# Altium footprint library 我的器件.PCBLIB: 450 footprints (part 13 of 29)
Each footprint in its own frame and in the unit in brackets; x right, y up, seen from the top. Pads: shape width x height; smd on the part's side, far side on the other; paste and mask are expansions set on the pad; w line width, h text height; cw(c..) or ccw(c..) is an arc to the next point about the centre after c.
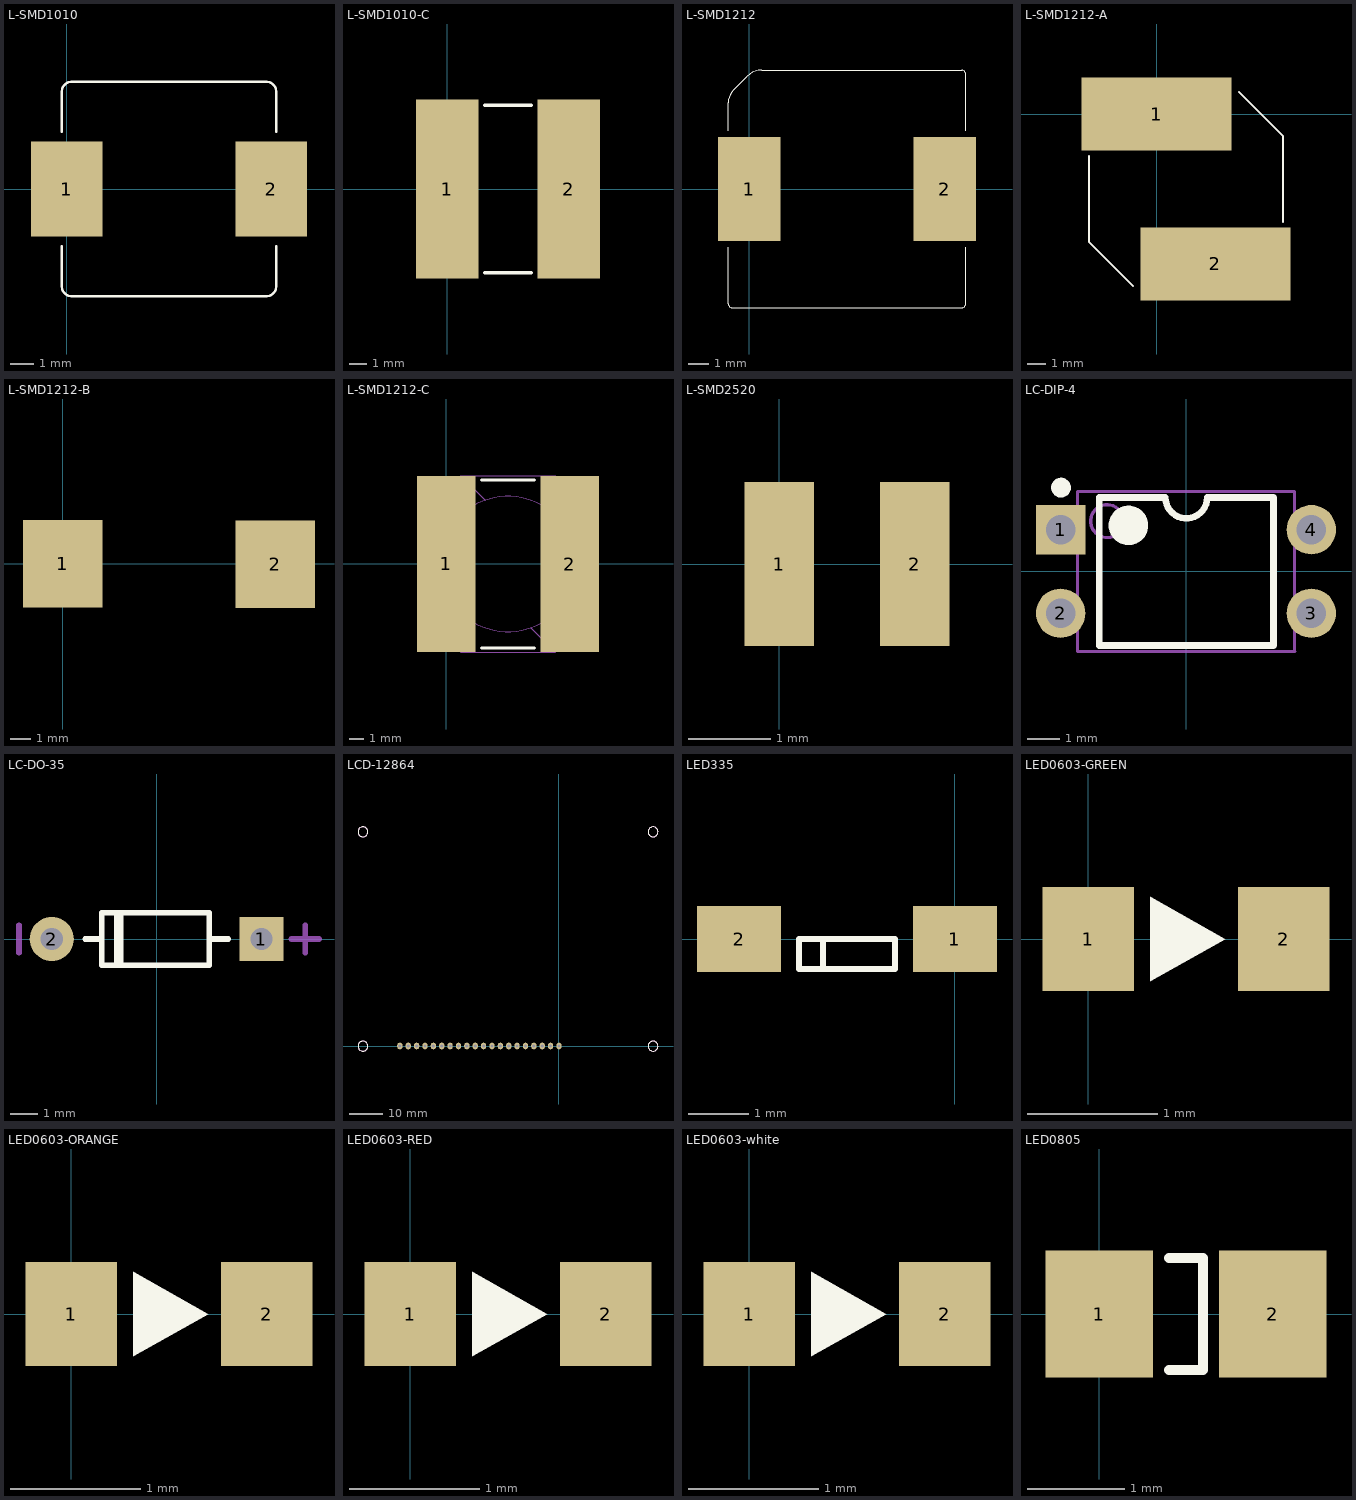
[diagram p12: the footprints below, top view; thin cyan lines are the x and y axes]

## L-SMD1010 [mm]
pads (2):
  rect 3x4 smd: 1(0,0) 2(8.6,0)
Top Overlay:
  lines w0.1: -0.2,-2.4 -0.2,-4.1 ccw(c0.2,-4.1) 0.2,-4.5 8.4,-4.5 ccw(c8.4,-4.1) 8.8,-4.1 8.8,-2.4 ; -0.2,2.4 -0.2,4.1 cw(c0.2,4.1) 0.2,4.5 8.4,4.5 cw(c8.4,4.1) 8.8,4.1 8.8,2.4
3D body: height 3, standoff 0, extent 9.35,-1.7 9.7,1.7
3D body: height 3, standoff 0, extent -1.1,-1.7 -0.75,1.7
3D body: height 4, standoff 0.1, extent -0.75,-5.05 9.35,5.05

## L-SMD1010-C [mm]
pads (2):
  rect 3.5x10 smd: 1(0,0) 2(6.8,0)
Top Overlay:
  lines w0.2: 2.1,-4.7 4.7,-4.7 ; 2.1,4.7 4.7,4.7
3D body: height 6.7, standoff 0.1, extent -0.625,-4.025 4.55,1.15
3D body: height 6.7, standoff 0.1, extent 2.25,-1.15 7.425,4.025
3D body: height 6.8, standoff 0.1, extent -1.6,-5 5.7,2.3
3D body: height 5, standoff 0.1, extent -1.6,1.15 2.25,5
3D body: height 5.2, standoff 4, extent -1.2,1.95 1.45,4.6
3D body: height 5.2, standoff 0.1, extent -1.2,2.75 0.65,4.6
3D body: height 5.2, standoff 0.1, extent 6.15,-4.6 8,-2.75
3D body: height 5.2, standoff 4, extent 5.35,-4.6 8,-1.95
3D body: height 5, standoff 0.1, extent 4.55,-5 8.4,-1.15
3D body: height 6.8, standoff 0.1, extent 1.1,-2.3 8.4,5
3D body: height 6.8, standoff 0, extent -0.396,-3.799 7.2,3.799

## L-SMD1212 [mm] "SMD  Inductance,Body 12mmX12mm"
height 10
pads (2):
  rect 3x5 smd: 1(0,0) 2(9.4,0)
Top Overlay:
  lines w0.05: -1,-2.8 -1,-5.5 ccw(c-0.8,-5.5) -0.8,-5.7 10.2,-5.7 ccw(c10.2,-5.5) 10.4,-5.5 10.4,-2.8 ; -1,2.8 -1,4.15 cw(c-0.155,4.15) -0.753,4.747 -0.083,5.417 cw(c0.6,4.734) 0.6,5.7 10.2,5.7 cw(c10.2,5.5) 10.4,5.5 10.4,2.8
3D body: height 1, standoff -0.01, extent -1.398,-6.098 10.798,6.098
3D body: height 7.5, standoff 0, extent -1.393,-6.098 10.8,6.099
3D body: height 7.51, standoff 0, extent -0.558,-5.289 10,5.29
3D body: height 7.52, standoff 0, extent 0.136,-4.591 9.3,4.591
3D body: height 1.2, standoff 0, extent -1.45,-1.75 0.05,1.75
3D body: height 1.2, standoff 0, extent 9.35,-1.75 10.85,1.75

## L-SMD1212-A [mm]
pads (2):
  rect 8.2x4 smd: 1(0,0) 2(3.2,-8.2)
Top Overlay:
  lines w0.1: -3.7,-2.3 -3.7,-7 -1.3,-9.4 ; 4.5,1.2 6.9,-1.2 6.9,-5.9
3D body: height 5.2, standoff 0.1, extent 4.8,-10.175 7.675,-7.3
3D body: height 7.7, standoff 0.1, extent -3.175,-8.875 3.275,-2.425
3D body: height 7.7, standoff 0.1, extent -0.075,-5.775 6.375,0.675
3D body: height 5, standoff 0.1, extent -4.4,-2.425 -0.075,1.9
3D body: height 5.2, standoff 5, extent -4.475,-2.175 -0.325,1.975
3D body: height 5.2, standoff 0.1, extent -4.475,-0.9 -1.6,1.975
3D body: height 5, standoff 0.1, extent 3.275,-10.1 7.6,-5.775
3D body: height 5.2, standoff 5, extent 3.525,-10.175 7.675,-6.025
3D body: height 7.8, standoff 0, extent -2.999,-8.695 6.199,0.5
3D body: height 7.7, standoff 0.1, extent -4.4,-10.1 4.8,-0.9
3D body: height 7.7, standoff 0.1, extent -1.6,-7.3 7.6,1.9

## L-SMD1212-B [mm]
pads (2):
  rect 3.8x4.2 smd: 1(0,0) 2(10.2,0)
3D body: height 2.4, standoff 0, extent 11.5,-2.1 11.9,2.1
3D body: height 0.3, standoff 0, extent 8.4,-2.1 11.9,2.1
3D body: height 0.3, standoff 0, extent -1.7,-2.1 1.8,2.1
3D body: height 2.4, standoff 0, extent -1.7,-2.1 -1.3,2.1
3D body: height 6, standoff 0.1, extent -1.3,-6.4 11.5,6.4

## L-SMD1212-C [mm]
pads (2):
  rect 4x12 smd: 1(0,0) 2(8.4,0)
Top Overlay:
  lines w0.2: 2.4,-5.7 6,-5.7 ; 2.4,5.7 6,5.7
Mechanical 1:
  circle w0.05: c4.2,0 r4.6
  lines w0.05: -0.15,1.55 -1.8,3.2 ; -0.125,1.525 -1.8,3.2 ; 5.75,-4.35 7.4,-6 ; 8.55,-1.55 10.2,-3.2 ; -1.8,3.2 1,6 ; -1.8,3.2 1,6 ; -1.8,3.2 -1.8,-3.2 1,-6 7.4,-6 ; 1,6 2.65,4.35 1,6 ; 1,6 7.4,6 10.2,3.2 10.2,-3.2 ; 7.4,-6 10.2,-3.2
3D body: height 7.7, standoff 0.1, extent -0.575,-4.775 5.875,1.675
3D body: height 7.7, standoff 0.1, extent 2.525,-1.675 8.975,4.775
3D body: height 5, standoff 0.1, extent -1.8,1.675 2.525,6
3D body: height 5.2, standoff 5, extent -1.875,1.925 2.275,6.075
3D body: height 5.2, standoff 0.1, extent -1.875,3.2 1,6.075
3D body: height 5, standoff 0.1, extent 5.875,-6 10.2,-1.675
3D body: height 5.2, standoff 5, extent 6.125,-6.075 10.275,-1.925
3D body: height 5.2, standoff 0.1, extent 7.4,-6.075 10.275,-3.2
3D body: height 7.8, standoff 0, extent -0.399,-4.595 8.799,4.6
3D body: height 7.7, standoff 0.1, extent -1.8,-6 7.4,3.2
3D body: height 7.7, standoff 0.1, extent 1,-3.2 10.2,6

## L-SMD2520 [mm]
height 1.2
pads (2):
  rect 0.85x2 smd: 1(0,0) 2(1.65,0)
3D body: height 0.9, standoff 0.4, extent -0.2,-0.875 1.875,0.875
3D body: height 1.2, standoff 0.9, extent -0.475,-1.1 2.125,1.1
3D body: height 0.4, standoff 0, extent -0.475,-1.1 2.125,1.1

## LC-DIP-4 [mm]
pads (4):
  rect 1.5x1.5 hole 0.9: 1(-3.81,1.27)
  round 1.5 hole 0.9: 2(-3.81,-1.27) 3(3.81,-1.27) 4(3.81,1.27)
Top Overlay:
  circle w0.3: c-3.8,2.55 r0.15
  circle w0.6: c-1.75,1.4 r0.3
  lines w0.2: -2.64,-2.25 2.66,-2.25 2.66,2.25 0.645,2.25 cw(c0.01,2.25) -0.625,2.25 -2.64,2.25 -2.64,-2.25
Mechanical 13:
  circle w0.1: c-2.4,1.53 r0.5
  lines w0.1: -3.3,-2.43 -3.3,2.43 3.3,2.43 3.3,-2.43 ; -3.29,-2.43 3.31,-2.43

## LC-DO-35 [mm]
pads (2):
  rect 1.6x1.6 hole 0.8: 1(3.81,0)
  round 1.6 hole 0.8: 2(-3.81,0)
Top Overlay:
  lines w0.2: -2.6,0 -2.001,0 ; -1.448,-0.95 -1.448,0.95 ; -1.3,-0.95 -1.3,0.95 ; 1.899,-0.95 -2.001,-0.95 -2.001,0.95 1.899,0.95 ; 1.911,-0.95 1.911,0.95 ; 1.911,0 2.6,0
Mechanical 15:
  lines w0.203: -5,-0.5 -5,0.5 ; 4.9,0 5.9,0 ; 5.4,-0.5 5.4,0.5
3D body "DO-35.STEP": height 1.92, standoff -1.9, extent -4.098,-0.888 4.072,0.914

## LCD-12864 [mm]
pads (20):
  oval 1.6x2 hole 1: 1(0,0) 2(-2.54,0) 3(-5.08,0) 4(-7.62,0) 5(-10.16,0) 6(-12.7,0) 7(-15.24,0) 8(-17.78,0) 9(-20.32,0) 10(-22.86,0) 11(-25.4,0) 12(-27.94,0) 13(-30.48,0) 14(-33.02,0) 15(-35.56,0) 16(-38.1,0) 17(-40.64,0) 18(-43.18,0) 19(-45.72,0) 20(-48.26,0)
Top Overlay:
  circle w0.2: c-59.46,-0.04 r1.5
  circle w0.2: c28.54,-0.04 r1.5
  circle w0.2: c28.54,64.96 r1.5
  circle w0.2: c-59.46,64.96 r1.5
Keep-Out Layer:
  circle w0.2: c-59.46,-0.04 r1.5
  circle w0.2: c28.54,-0.04 r1.5
  circle w0.2: c28.54,64.96 r1.5
  circle w0.2: c-59.46,64.96 r1.5
3D body: height 15.2, standoff 6.6, extent -54.465,32.71 24.05,58.47
3D body: height 15.2, standoff 6.6, extent -54.47,6.95 24.045,32.71
3D body: height 14.7, standoff 6.6, extent -51.71,13.21 21.29,52.21
3D body: height 6.6, standoff 5, extent -61.96,-2.54 31.04,67.46
3D body: height 6.7, standoff 4.9, extent -0.9,-1.1 0.9,1.1
3D body: height 7.7, standoff -2, extent -0.4,-0.4 0.4,0.4
3D body: height 7.7, standoff -2, extent -2.94,-0.4 -2.14,0.4
3D body: height 6.7, standoff 4.9, extent -3.44,-1.1 -1.64,1.1
3D body: height 7.7, standoff -2, extent -5.48,-0.4 -4.68,0.4
3D body: height 6.7, standoff 4.9, extent -5.98,-1.1 -4.18,1.1
3D body: height 7.7, standoff -2, extent -8.02,-0.4 -7.22,0.4
3D body: height 6.7, standoff 4.9, extent -8.52,-1.1 -6.72,1.1
3D body: height 7.7, standoff -2, extent -10.56,-0.4 -9.76,0.4
3D body: height 6.7, standoff 4.9, extent -11.06,-1.1 -9.26,1.1
3D body: height 7.7, standoff -2, extent -13.1,-0.4 -12.3,0.4
3D body: height 6.7, standoff 4.9, extent -13.6,-1.1 -11.8,1.1
3D body: height 7.7, standoff -2, extent -15.64,-0.4 -14.84,0.4
3D body: height 6.7, standoff 4.9, extent -16.14,-1.1 -14.34,1.1
3D body: height 7.7, standoff -2, extent -18.18,-0.4 -17.38,0.4
3D body: height 6.7, standoff 4.9, extent -18.68,-1.1 -16.88,1.1
3D body: height 7.7, standoff -2, extent -20.72,-0.4 -19.92,0.4
3D body: height 6.7, standoff 4.9, extent -21.22,-1.1 -19.42,1.1
3D body: height 7.7, standoff -2, extent -23.26,-0.4 -22.46,0.4
3D body: height 6.7, standoff 4.9, extent -23.76,-1.1 -21.96,1.1
3D body: height 7.7, standoff -2, extent -25.8,-0.4 -25,0.4
3D body: height 6.7, standoff 4.9, extent -26.3,-1.1 -24.5,1.1
3D body: height 7.7, standoff -2, extent -28.34,-0.4 -27.54,0.4
3D body: height 6.7, standoff 4.9, extent -28.84,-1.1 -27.04,1.1
3D body: height 7.7, standoff -2, extent -30.88,-0.4 -30.08,0.4
3D body: height 6.7, standoff 4.9, extent -31.38,-1.1 -29.58,1.1
3D body: height 7.7, standoff -2, extent -33.42,-0.4 -32.62,0.4
3D body: height 6.7, standoff 4.9, extent -33.92,-1.1 -32.12,1.1
3D body: height 7.7, standoff -2, extent -35.96,-0.4 -35.16,0.4
3D body: height 6.7, standoff 4.9, extent -36.46,-1.1 -34.66,1.1
3D body: height 7.7, standoff -2, extent -38.5,-0.4 -37.7,0.4
3D body: height 6.7, standoff 4.9, extent -39,-1.1 -37.2,1.1
3D body: height 7.7, standoff -2, extent -41.04,-0.4 -40.24,0.4
3D body: height 6.7, standoff 4.9, extent -41.54,-1.1 -39.74,1.1
3D body: height 7.7, standoff -2, extent -43.58,-0.4 -42.78,0.4
3D body: height 6.7, standoff 4.9, extent -44.08,-1.1 -42.28,1.1
3D body: height 7.7, standoff -2, extent -46.12,-0.4 -45.32,0.4
3D body: height 6.7, standoff 4.9, extent -46.62,-1.1 -44.82,1.1
3D body: height 7.7, standoff -2, extent -48.66,-0.4 -47.86,0.4
3D body: height 6.7, standoff 4.9, extent -49.16,-1.1 -47.36,1.1
3D body: height 9.6, standoff 6.6, extent 24.04,10.46 31.04,54.46

## LED335 [mm]
pads (2):
  rect 1.4x1.1 smd: 1(0,0) 2(-3.6,0)
Top Overlay:
  lines w0.1: -2.2,-0.5 -2.2,0 ; -2.6,-0.5 -2.6,0 -1,0 -1,-0.5 -2.6,-0.5
3D body: height 0.6, standoff 0.2, extent -2,-0.5 -1.6,-0.2
3D body: height 0.6, standoff 0.1, extent -3.8,-0.4 -3.2,-0.2
3D body: height 0.6, standoff 0.1, extent -0.4,-0.4 0.2,-0.2
3D body: height 0.7, standoff 0.1, extent -2.8,-1 -0.8,-0.2
3D body: height 0.8, standoff 0, extent -3.2,-1 -0.4,0.4
3D body: height 0.8, standoff 0.7, extent -3.2,-1 -0.4,0.4
3D body: height 0.2, standoff 0, extent -3.8,-0.4 -3.2,0.4
3D body: height 0.2, standoff 0, extent -0.4,-0.4 0.2,0.4
3D body: height 0.1, standoff 0, extent -3.2,-1 -0.4,0.4

## LED0603-GREEN [mm]
pads (2):
  rect 0.7x0.8 smd: 1(0,0) 2(1.5,0)
Top Overlay:
  region: 0.475,0.325 0.475,-0.325 1.05,0
3D body: height 0.38, standoff 0.32, extent 0.7,-0.042 0.962,0.307
3D body: height 0.35, standoff 0.2, extent 0.895,0.245 0.955,0.305
3D body: height 0.35, standoff 0.3, extent 0.72,-0.03 0.78,0.03
3D body: height 0.3, standoff 0.2, extent 0.65,-0.1 0.85,0.1
3D body: height 0.21, standoff 0.2, extent 0.525,-0.375 1.55,0.375
3D body: height 0.21, standoff 0.2, extent -0.05,-0.375 0.95,0.377
3D body: height 0.2, standoff 0, extent 0.75,-0.4 1.55,0.4
3D body: height 0.65, standoff 0.21, extent 0.225,-0.4 1.225,0.4
3D body: height 0.2, standoff 0, extent -0.05,-0.4 0.75,0.4

## LED0603-ORANGE [mm]
pads (2):
  rect 0.7x0.8 smd: 1(0,0) 2(1.5,0)
Top Overlay:
  region: 0.475,0.325 0.475,-0.325 1.05,0
3D body: height 0.38, standoff 0.32, extent 0.7,-0.042 0.962,0.307
3D body: height 0.35, standoff 0.2, extent 0.895,0.245 0.955,0.305
3D body: height 0.35, standoff 0.3, extent 0.72,-0.03 0.78,0.03
3D body: height 0.3, standoff 0.2, extent 0.65,-0.1 0.85,0.1
3D body: height 0.21, standoff 0.2, extent 0.525,-0.375 1.55,0.375
3D body: height 0.21, standoff 0.2, extent -0.05,-0.375 0.95,0.377
3D body: height 0.2, standoff 0, extent 0.75,-0.4 1.55,0.4
3D body: height 0.65, standoff 0.21, extent 0.225,-0.4 1.225,0.4
3D body: height 0.2, standoff 0, extent -0.05,-0.4 0.75,0.4

## LED0603-RED [mm]
pads (2):
  rect 0.7x0.8 smd: 1(0,0) 2(1.5,0)
Top Overlay:
  region: 0.475,0.325 0.475,-0.325 1.05,0
3D body: height 0.38, standoff 0.32, extent 0.7,-0.042 0.962,0.307
3D body: height 0.35, standoff 0.2, extent 0.895,0.245 0.955,0.305
3D body: height 0.35, standoff 0.3, extent 0.72,-0.03 0.78,0.03
3D body: height 0.3, standoff 0.2, extent 0.65,-0.1 0.85,0.1
3D body: height 0.21, standoff 0.2, extent 0.525,-0.375 1.55,0.375
3D body: height 0.21, standoff 0.2, extent -0.05,-0.375 0.95,0.377
3D body: height 0.2, standoff 0, extent 0.75,-0.4 1.55,0.4
3D body: height 0.65, standoff 0.21, extent 0.225,-0.4 1.225,0.4
3D body: height 0.2, standoff 0, extent -0.05,-0.4 0.75,0.4

## LED0603-white [mm]
pads (2):
  rect 0.7x0.8 smd: 1(0,0) 2(1.5,0)
Top Overlay:
  region: 0.475,0.325 0.475,-0.325 1.05,0
3D body: height 0.38, standoff 0.32, extent 0.7,-0.042 0.962,0.307
3D body: height 0.35, standoff 0.2, extent 0.895,0.245 0.955,0.305
3D body: height 0.35, standoff 0.3, extent 0.72,-0.03 0.78,0.03
3D body: height 0.3, standoff 0.2, extent 0.65,-0.1 0.85,0.1
3D body: height 0.21, standoff 0.2, extent 0.525,-0.375 1.55,0.375
3D body: height 0.21, standoff 0.2, extent -0.05,-0.375 0.95,0.377
3D body: height 0.2, standoff 0, extent 0.75,-0.4 1.55,0.4
3D body: height 0.65, standoff 0.21, extent 0.225,-0.4 1.225,0.4
3D body: height 0.2, standoff 0, extent -0.05,-0.4 0.75,0.4

## LED0805 [mm]
height 2
pads (2):
  rect 1.1x1.3 smd: 1(0,0) 2(1.778,0)
Top Overlay:
  lines w0.1: 0.714,-0.575 1.064,-0.575 1.064,0.575 0.714,0.575
3D body: height 0.31, standoff 0.3, extent 1.589,-0.7 1.764,0.7
3D body: height 0.3, standoff 0, extent -0.236,-0.7 2.014,0.7
3D body: height 0.31, standoff 0.3, extent 0.667,-0.7 2.014,0.7
3D body: height 0.31, standoff 0.3, extent -0.236,-0.7 0.592,0.7
3D body: height 0.65, standoff 0.3, extent 0.526,0.314 0.575,0.364
3D body: height 0.5, standoff 0.3, extent 0.689,-0.2 1.089,0.2
3D body: height 1, standoff 0.3, extent 0.189,-0.7 1.589,0.7
3D body: height 0.55, standoff 0.5, extent 0.79,-0.1 0.989,0.1
3D body: height 0.65, standoff 0.55, extent 0.864,-0.025 0.914,0.025
3D body: height 0.65, standoff 0.6, extent 0.525,-0.025 0.914,0.364